# Altium schematic symbol library LATTICEPLDS_Library.SchLib: 291 symbols (part 9 of 32)
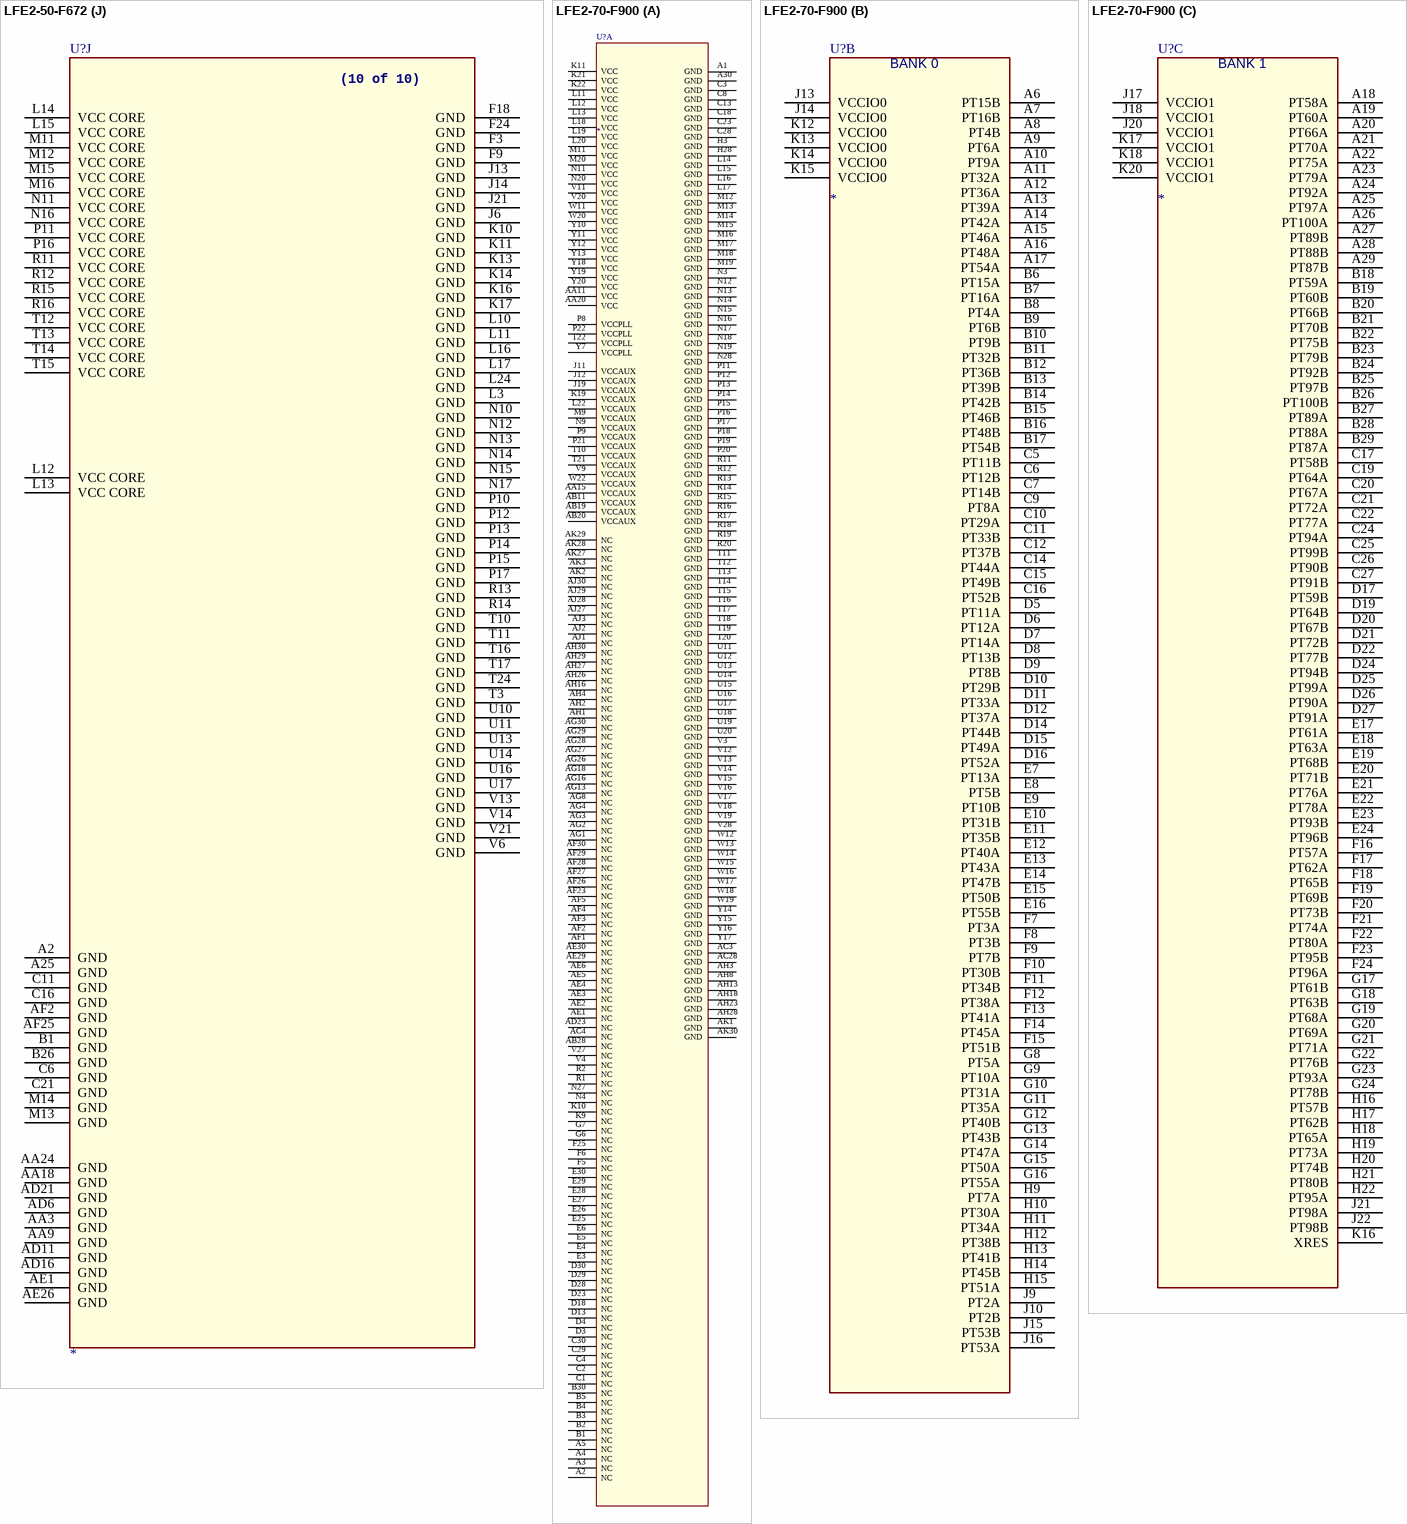
[diagram p311: symbols LFE2-50-F672 to LFE2-70-F900]

## LFE2-50-F672
designator U?
footprint fpBGA484
part A pins: D1 PL2B(H) / VREF1_7, D2 PL2A(H) / VREF2_7, E1 PL7B, E2 PL7A, E3 PL6B(H), E4 PL6A(H), F1 PL9B, F2 PL9A, F4 VCCIO_7 (power), F5 PL5B, F6 PL5A, G1 PL13B, G2 PL13A, G3 PL11B, G4 PL11A, H1 PL17A, H2 PL17B, H3 PL14A(H), H4 PL14B(H), H5 PL8B(H), H6 PL8A(H) / LDQS8, H7 PL12A(H), H8 PL10A(H), J1 PL19A, J2 PL19B, J3 PL16A(H) / LDQS16, J4 PL15B, J5 PL15A, J7 VCCIO_7 (power), J8 PL12B(H), J9 PL10B(H), K1 PL24A(H) / LDQS24, K2 PL23B, K3 PL23A, K4 PL16B(H), K5 PL39B(H), K6 PL18A(H), K7 PL18B(H), K8 PL38B, K9 VCCAUX_7 (power), L1 PL25A / LUM0_SPLLT_IN_A, L2 PL24B(H), L4 VCCIO_7 (power), L5 PL40B, L6 PL39A(H), L7 PL40A, L8 PL38A, L9 VCCAUX_7 (power), M1 PL26A / LUM0_SPLLT_FB_A, M2 PL25B / LUM0_SPLLC_IN_A, M6 PL42A, M7 PCLKT7_0 / PL44A, M8 LUM0_VCCPLL (power), M9 VCCIO_7 (power), M10 VCCIO_7 (power), N1 PL37A(H), N2 PL26B / LUM0_SPLLC_FB_A, N8 PL42B, N9 PCLKC7_0 / PL44B, P1 LDQS41 / PL41A(H) (in), P2 PL41B(H), R1 PL43A(H) (in), R2 PL43B(H)
part B pins: AA1 PL68A, AA2 PL60B(H) / LLM0_GDLLC_IN_A, AA4 VCCIO_6 (power), AB1 PL68B, AB2 PL75B(H), AB3 LDQS75 / PL75A(H), AC1 PL72A, AC2 PL78A, AD1 PL72B, AD2 PL74B, AD3 PL78B, AE2 PL74A, M4 PL46A(H) / PCLKT6_0, M5 PL46B(H) / PCLKC6_0, N3 PL48A(H), N4 PL48B(H), N5 PL49A, N7 PL47A / VREF2_6, P3 PL54A(H), P4 PL52B(H), P5 PL52A(H), P6 PL51B, P7 PL49B, P8 PL51A, P9 PL47B / VREF1_6, R3 PL54B(H), R4 PL55A, R5 PL57B, R6 PL58A(H) / LDQS58, R7 PL58B(H), R8 LLM0_VCCPLL (power), R9 VCCIO_6 (power), R10 VCCIO_6 (power), T1 PL50A(H) / LDQS50, T2 PL50B(H), T4 VCCIO_6 (power), T5 PL61A / LLM0_GDLLT_FB_A, T6 PL57A, T7 PL61B / LLM0_GDLLC_FB_A, T8 LLM0_PLLCAP (power), T9 VCCAUX_6 (power), U1 PL53A, U2 PL55B, U3 PL63A(H) / LLM0_GPLLT_IN_A, U4 PL63B(H) / LLM0_GPLLC_IN_A, U5 PL64B / LLM0_GPLLC_FB_A, U6 PL70B, U7 PL69B(H), U8 PL69A(H), U9 VCCAUX_6 (power), V1 PL53B, V2 PL56A(H), V3 PL64A / LLM0_GPLLT_FB_A, V4 PL65A(H), V5 PL65B(H), V7 VCCIO_6 (power), V8 PL70A, W1 PL59A, W2 PL56B(H), W3 PL67A(H) / LDQS67, W4 PL67B(H), W5 PL71B(H), W6 PL71A(H), W7 PL76A, W8 PL76B, Y1 PL60A(H) / LLM0_GDLLT_IN_A, Y2 PL59B, Y3 PL66A, Y4 PL66B, Y5 PL73B(H), Y6 PL73A(H), Y7 PL77A(H), Y8 PL77B(H)
part C pins: AA6 PB6A / BDSQ6, AA7 PB8A, AA10 PB21B, AA11 PB25A, AA12 PB30A, AA13 PB33B, AA14 PB38B, AA15 PB43B, AB6 PB6B, AB7 PB8B, AB8 PB23A, AB9 PB26A, AB10 PB23B, AB11 PB27B, AB12 PB31A, AB13 PB40B, AB14 PB41B, AB15 PB36A, AC4 PB3A, AC5 PB7A, AC6 VCCIO_5 (power), AC7 PB10A, AC8 PB22A, AC9 PB25B, AC10 PB29A, AC11 VCCIO_5 (power), AC12 PB32B, AC13 BDQS33 / PB33A, AC14 PB34B, AD4 PB3B, AD5 PB7B, AD7 PB10B, AD8 PB22B, AD9 PB26B, AD10 PB29B, AD12 PB32A, AD13 PB34A, AD14 PB43A, AE3 PB2A / VREF2_5, AE4 PB4A, AE5 PB9A, AE6 PB24A / BDSQ24, AE7 PB28A, AE8 PB35A, AE9 PB37A, AE10 PB39A, AE11 BDQS42 / PB42A, AE12 PCLKT5_0 / PB44A, AF3 PB2B / VREF1_5, AF4 PB4B, AF5 PB9B, AF6 PB24B, AF7 PB28B, AF8 PB35B, AF9 PB37B, AF10 PB39B, AF11 PB42B, AF12 PCLKC5_0 / PB44B, U12 VCCIO_5 (power), V9 PB5A, V10 VCCAUX_5 (power), V11 VCCAUX_5 (power), V12 VCCIO_5 (power), W9 PB5B, W10 PB20A, W11 PB21A, W12 PB30B, W13 PB38A, W14 PB40A, Y9 VCCIO_5 (power), Y10 PB20B, Y11 PB27A, Y12 PB31B, Y13 PB36B, Y14 PB41A
part D pins: AA16 PB53A, AA17 PB63B, AA19 PB65A, AA20 PB68A, AA21 PB79B, AB16 PB54B, AB17 PB51A / BDQS51, AB18 PB57B, AB19 PB61A, AB20 PB77A, AB21 BDQS78 / PB78A, AB22 PB81B, AB23 VREF1_4 / PB82B, AC15 PB49B / PCLKC4_0, AC16 VCCIO_4 (power), AC17 PB54A, AC18 PB59A, AC19 PB60A / BDQS60, AC20 PB77B, AC21 VCCIO_4 (power), AC22 PB78B, AC23 PB76B, AD15 PB49A / PCLKT4_0, AD17 PB58A, AD18 PB58B, AD19 PB59B, AD20 BDQS69 / PB69A, AD22 PB74B, AD23 PB76A, AE13 PB50A, AE14 PB52A, AE15 PB55A, AE16 PB56A, AE17 PB60B, AE18 PB62B, AE19 PB61B, AE20 PB67B, AE21 PB69B, AE22 PB74A, AE23 PB75B, AE24 PB80B, AF13 PB50B, AF14 PB52B, AF15 PB55B, AF16 PB56B, AF17 PB62A, AF18 PB64A, AF19 PB64B, AF20 PB67A, AF21 PB70A, AF22 PB70B, AF23 PB75A, AF24 PB80A, U15 VCCIO_4 (power), V15 VCCIO_4 (power), V16 VCCAUX_4 (power), V17 VCCAUX_4 (power), W15 PB53B, W16 PB63A, W17 PB65B, W18 PB68B, W19 PB79A, Y15 PB51B, Y16 PB57A, Y17 PB66B, Y18 VCCIO_4 (power), Y19 PB66A, Y20 PB81A, Y21 VREF2_4 / PB82A
part E pins: AA23 VCCIO_3 (power), AA26 PR69B(H), L25 PR46A(H) / PCLKT3_0, L26 PR46B(H) / PCLKC3_0, M25 PR48A(H), M26 PR48B(H), N18 PR47B / VREF2_3, N19 PR49B, N20 PR49A, N21 PR47A / VREF1_3, N22 PR51B, N25 PR50A(H) / RDQS50, N26 PR50B(H), P18 RLM0_VCCPLL (power), P19 PR53A, P20 PR54B(H), P21 PR53B, P22 PR52A(H), P23 PR52B(H), P25 PR56A(H), P26 PR56B(H), R17 VCCIO_3 (power), R18 VCCIO_3 (power), R19 PR54A(H), R20 RLM0_PLLCAP (power), R21 PR51A, R22 PR57B, R23 PR55A, R24 PR55B, R25 RDQS58 / PR58A(H), R26 PR58B(H), T18 VCCAUX_3 (power), T19 RLM0_GDLLC_FB_A / PR61B, T20 PR59B, T21 PR57A, T22 PR59A, T23 VCCIO_3 (power), T25 RLM0_GDLLC_IN_A / PR60B(H), T26 RLM0_GDLLT_IN_A / PR60A(H), U18 VCCAUX_3 (power), U19 PR68A, U20 RLM0_GDLLT_FB_A / PR61A, U21 PR68B, U22 RLM0_GPLLC_FB_A / PR64B, U23 RLM0_GPLLT_FB_A / PR64A, U24 RLM0_GPLLC_IN_A / PR63B(H), U25 RLM0_GPLLT_IN_A / PR63A(H), U26 PR65A(H), V20 VCCIO_3 (power), V23 PR70A, V24 PR66B, V25 PR66A, V26 PR65B(H), W24 PR70B, W25 PR67B(H), W26 RDSQ67 / PR67A(H), Y26 PR69A(H)
part F pins: B24 PR7B, B25 PR9A, C23 PR6A(H), C24 PR7A, C25 PR10A(H), C26 PR12A(H), D23 PR6B(H), D24 PR9B, D25 PR10B(H), D26 PR12B(H), E22 PR2B(H) / VREF2_2, E24 PR11A, E25 PR16A(H) / RDQS16, E26 PR16B(H), F21 PR2A(H) / VREF1_2, F22 PR11B, F23 VCCIO_2 (power), F25 PR18A(H), F26 PR18B(H), G21 PR5B, G22 PR8A(H) / RDQS8, G23 PR14A(H), G24 PR14B(H), G25 PR19A, G26 PR19B, H20 PR5A, H21 PR8B(H), H22 PR15A, H23 PR23A, H24 PR23B, H25 RDQS24 / PR24A(H), H26 PR24B(H), J19 PR13A, J20 VCCIO_2 (power), J22 PR15B, J23 RUM0_SPLLC_IN_A / PR25B, J24 PR37A(H), J25 RUM0_SPLLT_FB_A / PR26A, J26 RUM0_SPLLC_FB_A / PR26B, K18 VCCAUX_2 (power), K19 PR13B, K20 PR17B, K21 PR38B, K22 PR43A(H), K23 RUM0_SPLLT_IN_A / PR25A, K24 PR37B(H), K25 RDQS41 / PR41A(H), K26 PR41B(H), L18 VCCAUX_2 (power), L19 PR17A, L20 RUM0_VCCPLL (power), L21 PR43B(H), L22 PR39B(H), L23 VCCIO_2 (power), M17 VCCIO_2 (power), M18 VCCIO_2 (power), M19 PR40A, M20 PR40B, M21 PR38A, M22 PR39A(H), M23 PCLKT2_0 / PR44A, M24 PR42B, N23 PR42A, N24 PCLKC2_0 / PR44B
part G pins: A12 PT49B, A13 PT53B, A14 PT55B, A15 PT54A, A16 PT57B, A17 PT61B, A18 PT64A, A19 PT66A, A20 PT66B, A21 PT74A, A22 PT74B, A23 PT79A, A24 PT79B, B12 PT49A, B13 PT53A, B14 PT55A, B15 PT57A, B16 PT60A, B17 PT61A, B18 PT64B, B19 PT69A, B20 PT70A, B21 PT70B, B22 PT76B, B23 PT76A, C14 PT51A, C15 PT54B, C17 PT59B, C18 PT60B, C19 PT71A, C20 PT75B, C22 PT77B, D13 PT51B, D14 PT48A / PCLKT1_0, D15 PT56B, D16 VCCIO_1 (power), D17 PT59A, D18 PT65A, D19 PT69B, D20 PT75A, D21 VCCIO_1 (power), D22 VREF1_1 / PT82A, E14 PT50A, E15 PT58B, E16 PT63B, E17 PT65B, E18 PT68A, E19 PT71B, E20 PT77A, E21 PT78B, E23 VREF2_1 / PT82B, F14 PT48B / PCLKC1_0, F15 PT56A, F16 PT62B, F17 PT67A, F19 PT78A, F20 PT80B, G14 PT50B, G15 PT58A, G16 PT63A, G17 PT68B, G18 VCCIO_1 (power), G19 PT67B, G20 PT81B, H15 PT52A, H17 PT52B, H18 PT62A, H19 PT80A, J15 VCCIO_1 (power), J16 VCCAUX_1 (power), J17 VCCAUX_1 (power), J18 PT81A, K15 VCCIO_1 (power)
part H pins: A3 PT9A, A4 PT9B, A5 PT27B, A6 PT32B, A7 PT35B, A8 PT37B, A9 PT39B, A10 PT42B, A11 PT45B, B2 PT8A, B3 PT8B, B4 PT22B, B5 PT27A, B6 PT32A, B7 PT35A, B8 PT37A, B9 PT39A, B10 PT42A, B11 PT45A, C1 PT6A, C2 PT6B, C3 PT10A, C4 PT10B, C5 PT23B, C7 PT26B, C8 PT31A, C9 PT36A, C10 PT41A, C12 PT41B, C13 PT44B, D3 PT7A, D4 PT7B, D5 PT23A, D6 VCCIO_0 (power), D7 PT26A, D8 PT31B, D9 PT29A, D10 PT34A, D11 VCCIO_0 (power), D12 PT43B, E5 PT3A, E6 PT3B, E7 PT4B, E8 PT25B, E9 PT29B, E10 PT30A, E11 PT36B, E12 PT38B, E13 PT44A, F7 PT4A, F8 PT24B, F10 PT25A, F11 PT30B, F12 PT34B, F13 PT43A, G5 PT2A / VREF1_0, G6 PT2B / VREF2_0, G7 PT5A, G8 PT5B, G9 VCCIO_0 (power), G10 PT28B, G11 PT33A, G12 PT38A, G13 PT40B, H9 PT24A, H10 PT28A, H11 PT33B, H12 PT40A, H13 PCLKT0_0 / PT46A, H14 PCLKC0_0 / PT46B, J10 VCCAUX_0 (power), J11 VCCAUX_0 (power), J12 VCCIO_0 (power), K12 VCCIO_0 (power)
part I pins: AA5 TDO (out), AA8 TDI (in), AA22 CCLK, AA25 PR73B / D5, AB4 TMS (in), AB5 VCCJ (power), AB24 INITN, AB25 PR76A / D0, AB26 PR73A / D6 / SPID1, AC3 TCK (in), AC24 CFG0, AC25 PR76B / CSN, AC26 PR75A / D2, AD24 CFG2, AD25 DONE, AD26 PR75B / D1, AE25 VCCIO_8 (power), H16 XRES, V18 VCCIO_8 (power), V19 PROGRAMN, V22 PR72A / DI / CSSPI0N, W20 CFG1, W21 PR77B / WRITEN, W22 PR74A / D4, W23 PR72B / D7 / SPID0, Y22 PR77A / CS1N, Y23 PR74B / D3, Y24 PR71B / DOUT/CSON / CSSPI1N, Y25 PR71A / BUSY / SISPI
part J pins: A2 GND (power), A25 GND (power), AA3 GND (power), AA9 GND (power), AA18 GND (power), AA24 GND (power), AD6 GND (power), AD11 GND (power), AD16 GND (power), AD21 GND (power), AE1 GND (power), AE26 GND (power), AF2 GND (power), AF25 GND (power), B1 GND (power), B26 GND (power), C6 GND (power), C11 GND (power), C16 GND (power), C21 GND (power), F3 GND (power), F9 GND (power), F18 GND (power), F24 GND (power), J6 GND (power), J13 GND (power), J14 GND (power), J21 GND (power), K10 GND (power), K11 GND (power), K13 GND (power), K14 GND (power), K16 GND (power), K17 GND (power), L3 GND (power), L10 GND (power), L11 GND (power), L12 VCC CORE (power), L13 VCC CORE (power), L14 VCC CORE (power), L15 VCC CORE (power), L16 GND (power), L17 GND (power), L24 GND (power), M11 VCC CORE (power), M12 VCC CORE (power), M13 GND (power), M14 GND (power), M15 VCC CORE (power), M16 VCC CORE (power), N10 GND (power), N11 VCC CORE (power), N12 GND (power), N13 GND (power), N14 GND (power), N15 GND (power), N16 VCC CORE (power), N17 GND (power), P10 GND (power), P11 VCC CORE (power), P12 GND (power), P13 GND (power), P14 GND (power), P15 GND (power), P16 VCC CORE (power), P17 GND (power), R11 VCC CORE (power), R12 VCC CORE (power), R13 GND (power), R14 GND (power), R15 VCC CORE (power), R16 VCC CORE (power), T3 GND (power), T10 GND (power), T11 GND (power), T12 VCC CORE (power), T13 VCC CORE (power), T14 VCC CORE (power), T15 VCC CORE (power), T16 GND (power), T17 GND (power), T24 GND (power), U10 GND (power), U11 GND (power), U13 GND (power), U14 GND (power), U16 GND (power), U17 GND (power), V6 GND (power), V13 GND (power), V14 GND (power), V21 GND (power)
part A text: BANK7; (1 of 10); DQS Group
part B text: BANK6; (2 of 10); DQS Group
part C text: BANK5; (3 of 10); DQS Group
part D text: BANK4; (4 of 10); DQS Group
part E text: BANK3; (5 of 10); DQS Group
part F text: BANK2; (6 of 10); DQS Group
part G text: BANK1; (7 of 10)
part H text: BANK0; (8 of 10)
part I text: BANK8; (9 of 10)
part J text: (10 of 10)

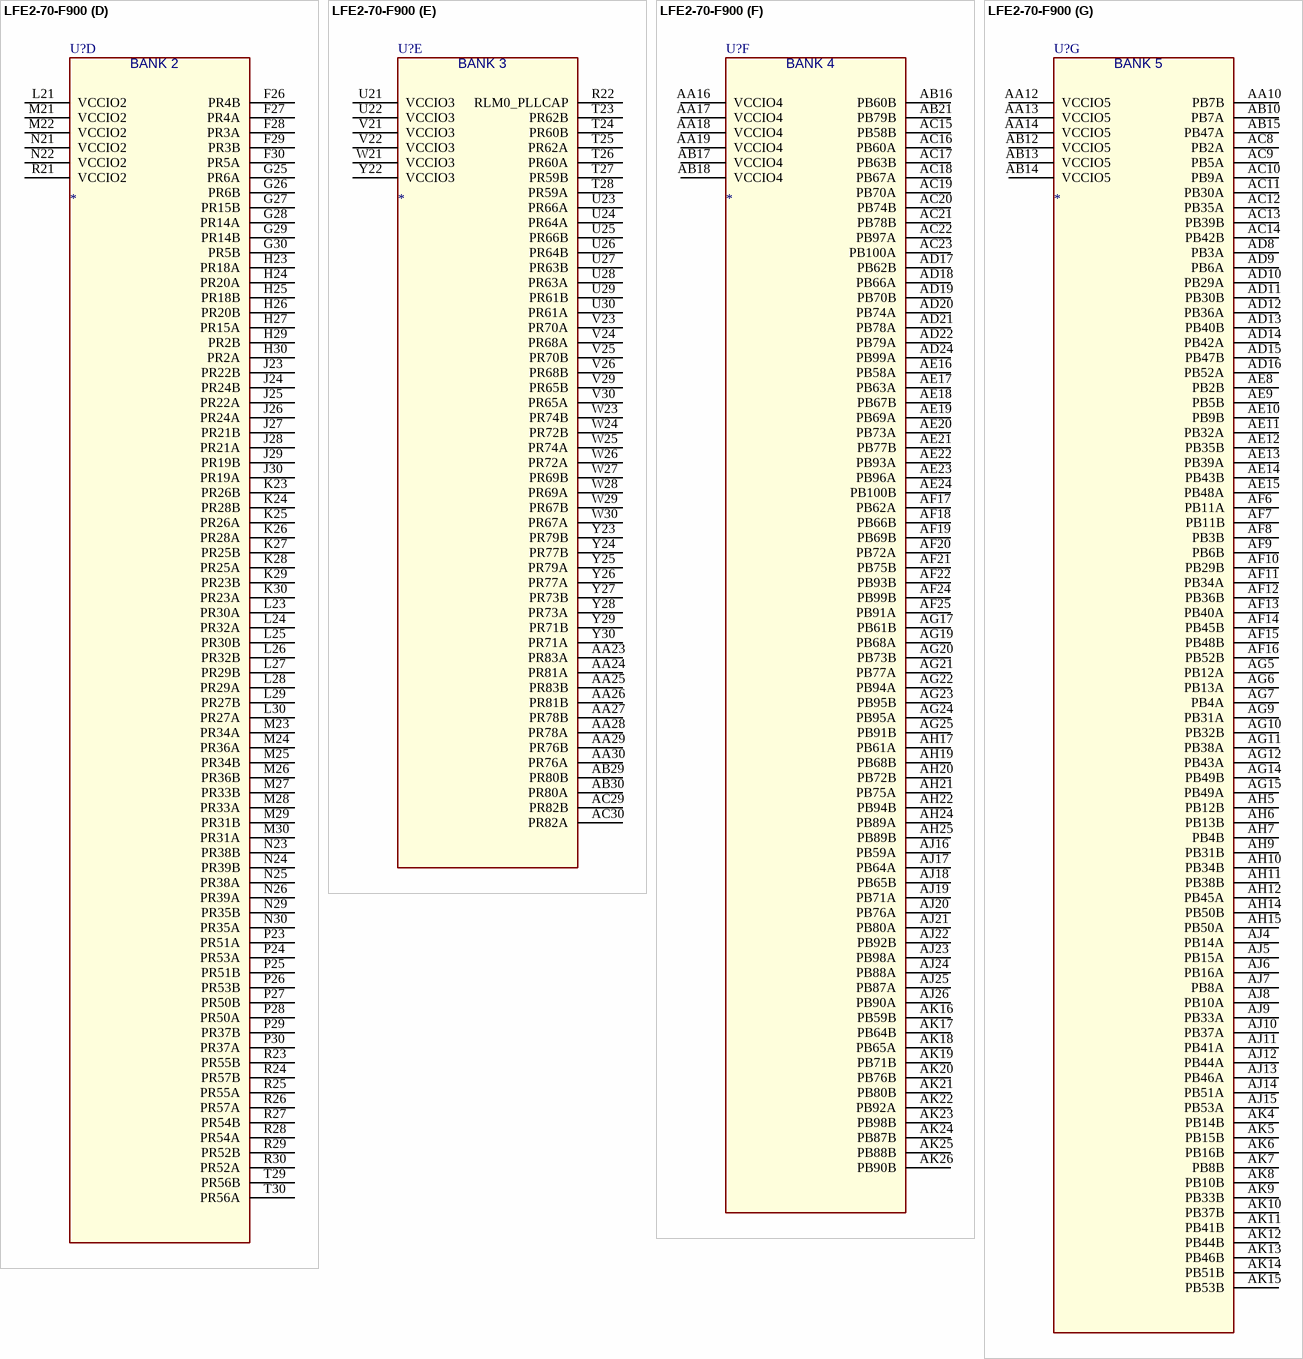
[diagram p91: symbol LFE2-70-F900]

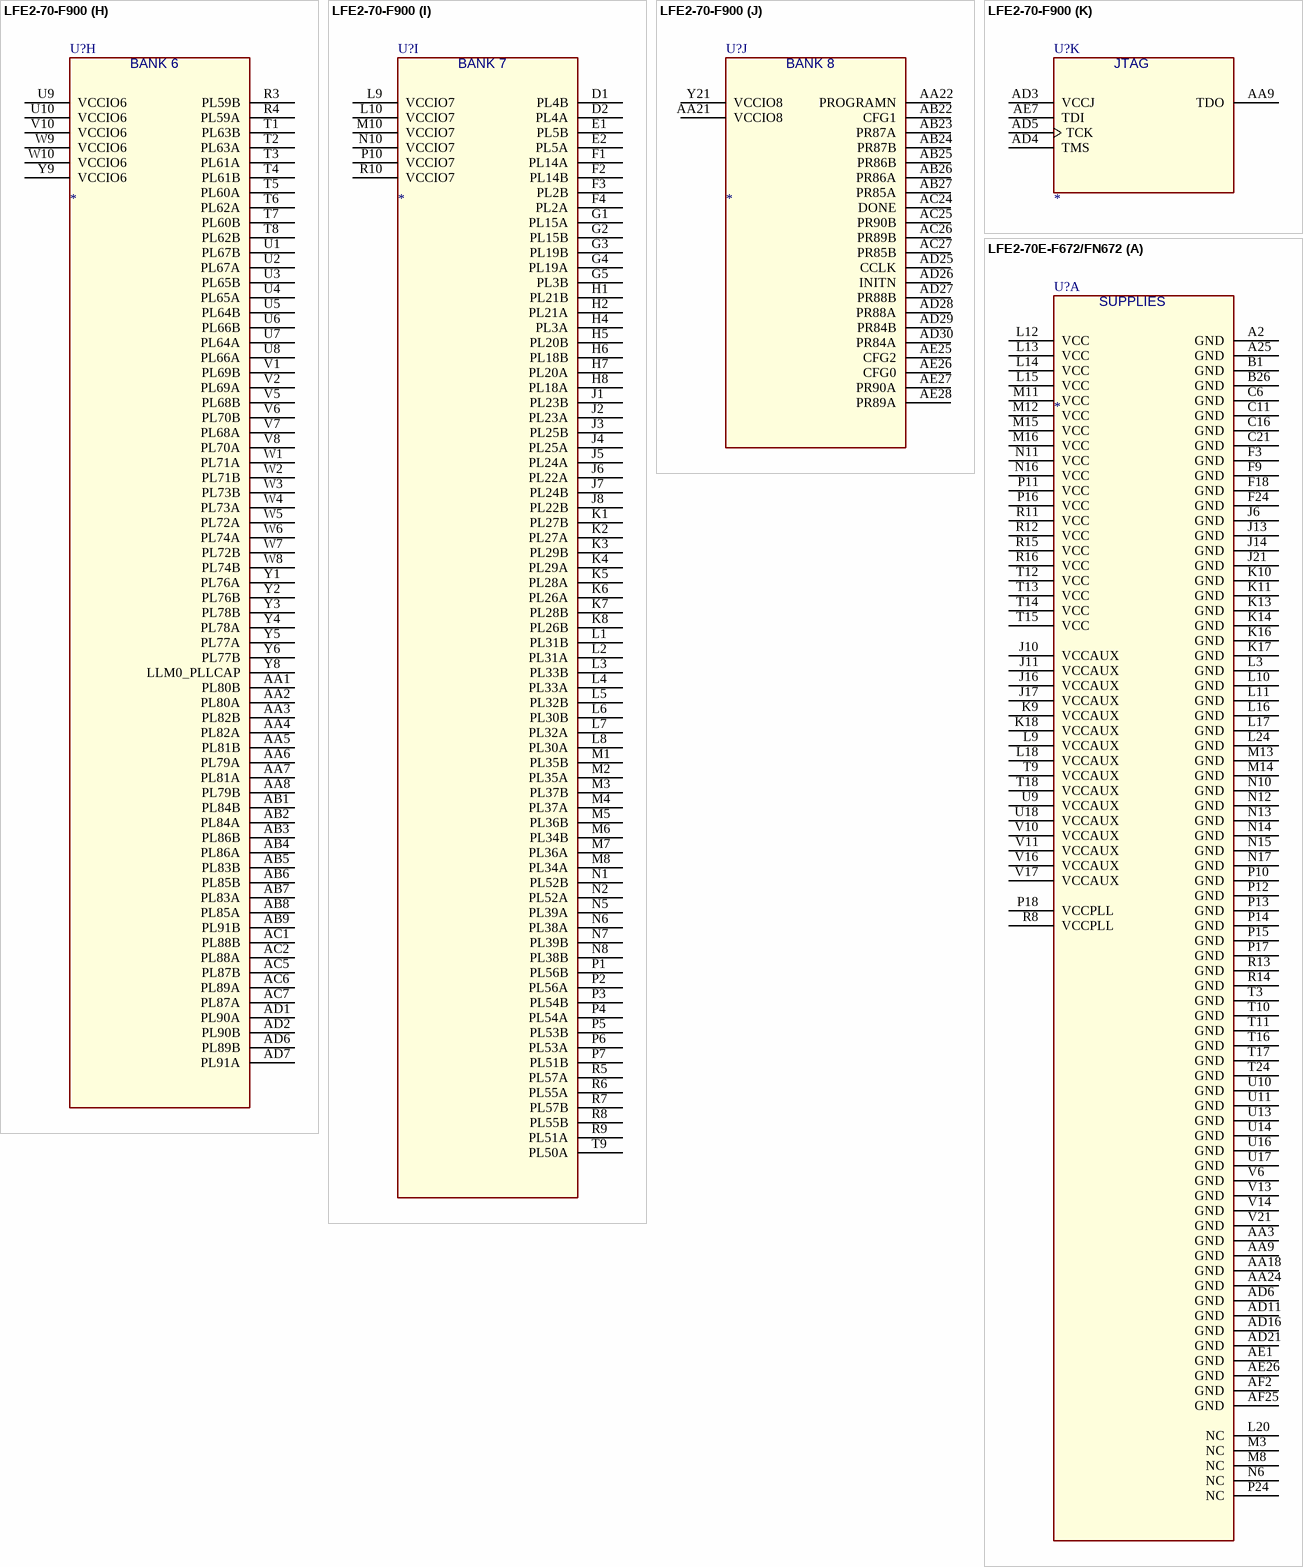
[diagram p92: symbols LFE2-70-F900 to LFE2-70E-F672/FN672]

## LFE2-70-F900
designator U?
SPLIT_INST: TRUE; SWAP_INFO: (S1+S2+S3+S4+S5+S6+S7+S8+S9+S10+S11)
part A pins: A1 GND (power), A2 NC, A3 NC, A4 NC, A5 NC, A30 GND (power), AA11 VCC (power), AA15 VCCAUX (power), AA20 VCC (power), AB11 VCCAUX (power), AB19 VCCAUX (power), AB20 VCCAUX (power), AB28 NC, AC3 GND (power), AC4 NC, AC28 GND (power), AD23 NC, AE1 NC, AE2 NC, AE3 NC, AE4 NC, AE5 NC, AE6 NC, AE29 NC, AE30 NC, AF1 NC, AF2 NC, AF3 NC, AF4 NC, AF5 NC, AF23 NC, AF26 NC, AF27 NC, AF28 NC, AF29 NC, AF30 NC, AG1 NC, AG2 NC, AG3 NC, AG4 NC, AG8 NC, AG13 NC, AG16 NC, AG18 NC, AG26 NC, AG27 NC, AG28 NC, AG29 NC, AG30 NC, AH1 NC, AH2 NC, AH3 GND (power), AH4 NC, AH8 GND (power), AH13 GND (power), AH16 NC, AH18 GND (power), AH23 GND (power), AH26 NC, AH27 NC, AH28 GND (power), AH29 NC, AH30 NC, AJ1 NC, AJ2 NC, AJ3 NC, AJ27 NC, AJ28 NC, AJ29 NC, AJ30 NC, AK1 GND (power), AK2 NC, AK3 NC, AK27 NC, AK28 NC, AK29 NC, AK30 GND (power), B1 NC, B2 NC, B3 NC, B4 NC, B5 NC, B30 NC, C1 NC, C2 NC, C3 GND (power), C4 NC, C8 GND (power), C13 GND (power), C18 GND (power), C23 GND (power), C28 GND (power), C29 NC, C30 NC, D3 NC, D4 NC, D13 NC, D18 NC, D23 NC, D28 NC, D29 NC, D30 NC, E3 NC, E4 NC, E5 NC, E6 NC, E25 NC, E26 NC, E27 NC, E28 NC, E29 NC, E30 NC, F5 NC, F6 NC, F25 NC, G6 NC, G7 NC, H3 GND (power), H28 GND (power), J11 VCCAUX (power), J12 VCCAUX (power), J19 VCCAUX (power), K9 NC, K10 NC, K11 VCC (power), K19 VCCAUX (power), K21 VCC (power), K22 VCC (power), L11 VCC (power), L12 VCC (power), L13 VCC (power), L14 GND (power), L15 GND (power), L16 GND (power), L17 GND (power), L18 VCC (power), L19 VCC (power), L20 VCC (power), L22 VCCAUX (power), M9 VCCAUX (power), M11 VCC (power), M12 GND (power), M13 GND (power), M14 GND (power), M15 GND (power), M16 GND (power), M17 GND (power), M18 GND (power), M19 GND (power), M20 VCC (power), N3 GND (power), N4 NC, N9 VCCAUX (power), N11 VCC (power), N12 GND (power), N13 GND (power), N14 GND (power), N15 GND (power), N16 GND (power), N17 GND (power), N18 GND (power), N19 GND (power), N20 VCC (power), N27 NC, N28 GND (power), P8 VCCPLL (power), P9 VCCAUX (power), P11 GND (power), P12 GND (power), P13 GND (power), P14 GND (power), P15 GND (power), P16 GND (power), P17 GND (power), P18 GND (power), P19 GND (power), P20 GND (power), P21 VCCAUX (power), P22 VCCPLL (power), R1 NC, R2 NC, R11 GND (power), R12 GND (power), R13 GND (power), R14 GND (power), R15 GND (power), R16 GND (power), R17 GND (power), R18 GND (power), R19 GND (power), R20 GND (power), T10 VCCAUX (power), T11 GND (power), T12 GND (power), T13 GND (power), T14 GND (power), T15 GND (power), T16 GND (power), T17 GND (power), T18 GND (power), T19 GND (power), T20 GND (power), T21 VCCAUX (power), T22 VCCPLL (power), U11 GND (power), U12 GND (power), U13 GND (power), U14 GND (power), U15 GND (power), U16 GND (power), U17 GND (power), U18 GND (power), U19 GND (power), U20 GND (power), V3 GND (power), V4 NC, V9 VCCAUX (power), V11 VCC (power), V12 GND (power), V13 GND (power), V14 GND (power), V15 GND (power), V16 GND (power), V17 GND (power), V18 GND (power), V19 GND (power), V20 VCC (power), V27 NC, V28 GND (power), W11 VCC (power), W12 GND (power), W13 GND (power), W14 GND (power), W15 GND (power), W16 GND (power), W17 GND (power), W18 GND (power), W19 GND (power), W20 VCC (power), W22 VCCAUX (power), Y7 VCCPLL (power), Y10 VCC (power), Y11 VCC (power), Y12 VCC (power), Y13 VCC (power), Y14 GND (power), Y15 GND (power), Y16 GND (power), Y17 GND (power), Y18 VCC (power), Y19 VCC (power), Y20 VCC (power)
part B pins: A6 PT15B, A7 PT16B, A8 PT4B, A9 PT6A, A10 PT9A, A11 PT32A, A12 PT36A, A13 PT39A, A14 PT42A, A15 PT46A, A16 PT48A, A17 PT54A, B6 PT15A, B7 PT16A, B8 PT4A, B9 PT6B, B10 PT9B, B11 PT32B, B12 PT36B, B13 PT39B, B14 PT42B, B15 PT46B, B16 PT48B, B17 PT54B, C5 PT11B, C6 PT12B, C7 PT14B, C9 PT8A, C10 PT29A, C11 PT33B, C12 PT37B, C14 PT44A, C15 PT49B, C16 PT52B, D5 PT11A, D6 PT12A, D7 PT14A, D8 PT13B, D9 PT8B, D10 PT29B, D11 PT33A, D12 PT37A, D14 PT44B, D15 PT49A, D16 PT52A, E7 PT13A, E8 PT5B, E9 PT10B, E10 PT31B, E11 PT35B, E12 PT40A, E13 PT43A, E14 PT47B, E15 PT50B, E16 PT55B, F7 PT3A, F8 PT3B, F9 PT7B, F10 PT30B, F11 PT34B, F12 PT38A, F13 PT41A, F14 PT45A, F15 PT51B, G8 PT5A, G9 PT10A, G10 PT31A, G11 PT35A, G12 PT40B, G13 PT43B, G14 PT47A, G15 PT50A, G16 PT55A, H9 PT7A, H10 PT30A, H11 PT34A, H12 PT38B, H13 PT41B, H14 PT45B, H15 PT51A, J9 PT2A, J10 PT2B, J13 VCCIO0 (power), J14 VCCIO0 (power), J15 PT53B, J16 PT53A, K12 VCCIO0 (power), K13 VCCIO0 (power), K14 VCCIO0 (power), K15 VCCIO0 (power)
part C pins: A18 PT58A, A19 PT60A, A20 PT66A, A21 PT70A, A22 PT75A, A23 PT79A, A24 PT92A, A25 PT97A, A26 PT100A, A27 PT89B, A28 PT88B, A29 PT87B, B18 PT59A, B19 PT60B, B20 PT66B, B21 PT70B, B22 PT75B, B23 PT79B, B24 PT92B, B25 PT97B, B26 PT100B, B27 PT89A, B28 PT88A, B29 PT87A, C17 PT58B, C19 PT64A, C20 PT67A, C21 PT72A, C22 PT77A, C24 PT94A, C25 PT99B, C26 PT90B, C27 PT91B, D17 PT59B, D19 PT64B, D20 PT67B, D21 PT72B, D22 PT77B, D24 PT94B, D25 PT99A, D26 PT90A, D27 PT91A, E17 PT61A, E18 PT63A, E19 PT68B, E20 PT71B, E21 PT76A, E22 PT78A, E23 PT93B, E24 PT96B, F16 PT57A, F17 PT62A, F18 PT65B, F19 PT69B, F20 PT73B, F21 PT74A, F22 PT80A, F23 PT95B, F24 PT96A, G17 PT61B, G18 PT63B, G19 PT68A, G20 PT69A, G21 PT71A, G22 PT76B, G23 PT93A, G24 PT78B, H16 PT57B, H17 PT62B, H18 PT65A, H19 PT73A, H20 PT74B, H21 PT80B, H22 PT95A, J17 VCCIO1 (power), J18 VCCIO1 (power), J20 VCCIO1 (power), J21 PT98A, J22 PT98B, K16 XRES, K17 VCCIO1 (power), K18 VCCIO1 (power), K20 VCCIO1 (power)
part D pins: F26 PR4B, F27 PR4A, F28 PR3A, F29 PR3B, F30 PR5A, G25 PR6A, G26 PR6B, G27 PR15B, G28 PR14A, G29 PR14B, G30 PR5B, H23 PR18A, H24 PR20A, H25 PR18B, H26 PR20B, H27 PR15A, H29 PR2B, H30 PR2A, J23 PR22B, J24 PR24B, J25 PR22A, J26 PR24A, J27 PR21B, J28 PR21A, J29 PR19B, J30 PR19A, K23 PR26B, K24 PR28B, K25 PR26A, K26 PR28A, K27 PR25B, K28 PR25A, K29 PR23B, K30 PR23A, L21 VCCIO2 (power), L23 PR30A, L24 PR32A, L25 PR30B, L26 PR32B, L27 PR29B, L28 PR29A, L29 PR27B, L30 PR27A, M21 VCCIO2 (power), M22 VCCIO2 (power), M23 PR34A, M24 PR36A, M25 PR34B, M26 PR36B, M27 PR33B, M28 PR33A, M29 PR31B, M30 PR31A, N21 VCCIO2 (power), N22 VCCIO2 (power), N23 PR38B, N24 PR39B, N25 PR38A, N26 PR39A, N29 PR35B, N30 PR35A, P23 PR51A, P24 PR53A, P25 PR51B, P26 PR53B, P27 PR50B, P28 PR50A, P29 PR37B, P30 PR37A, R21 VCCIO2 (power), R23 PR55B, R24 PR57B, R25 PR55A, R26 PR57A, R27 PR54B, R28 PR54A, R29 PR52B, R30 PR52A, T29 PR56B, T30 PR56A
part E pins: AA23 PR83A, AA24 PR81A, AA25 PR83B, AA26 PR81B, AA27 PR78B, AA28 PR78A, AA29 PR76B, AA30 PR76A, AB29 PR80B, AB30 PR80A, AC29 PR82B, AC30 PR82A, R22 RLM0_PLLCAP, T23 PR62B, T24 PR60B, T25 PR62A, T26 PR60A, T27 PR59B, T28 PR59A, U21 VCCIO3 (power), U22 VCCIO3 (power), U23 PR66A, U24 PR64A, U25 PR66B, U26 PR64B, U27 PR63B, U28 PR63A, U29 PR61B, U30 PR61A, V21 VCCIO3 (power), V22 VCCIO3 (power), V23 PR70A, V24 PR68A, V25 PR70B, V26 PR68B, V29 PR65B, V30 PR65A, W21 VCCIO3 (power), W23 PR74B, W24 PR72B, W25 PR74A, W26 PR72A, W27 PR69B, W28 PR69A, W29 PR67B, W30 PR67A, Y22 VCCIO3 (power), Y23 PR79B, Y24 PR77B, Y25 PR79A, Y26 PR77A, Y27 PR73B, Y28 PR73A, Y29 PR71B, Y30 PR71A
part F pins: AA16 VCCIO4 (power), AA17 VCCIO4 (power), AA18 VCCIO4 (power), AA19 VCCIO4 (power), AB16 PB60B, AB17 VCCIO4 (power), AB18 VCCIO4 (power), AB21 PB79B, AC15 PB58B, AC16 PB60A, AC17 PB63B, AC18 PB67A, AC19 PB70A, AC20 PB74B, AC21 PB78B, AC22 PB97A, AC23 PB100A, AD17 PB62B, AD18 PB66A, AD19 PB70B, AD20 PB74A, AD21 PB78A, AD22 PB79A, AD24 PB99A, AE16 PB58A, AE17 PB63A, AE18 PB67B, AE19 PB69A, AE20 PB73A, AE21 PB77B, AE22 PB93A, AE23 PB96A, AE24 PB100B, AF17 PB62A, AF18 PB66B, AF19 PB69B, AF20 PB72A, AF21 PB75B, AF22 PB93B, AF24 PB99B, AF25 PB91A, AG17 PB61B, AG19 PB68A, AG20 PB73B, AG21 PB77A, AG22 PB94A, AG23 PB95B, AG24 PB95A, AG25 PB91B, AH17 PB61A, AH19 PB68B, AH20 PB72B, AH21 PB75A, AH22 PB94B, AH24 PB89A, AH25 PB89B, AJ16 PB59A, AJ17 PB64A, AJ18 PB65B, AJ19 PB71A, AJ20 PB76A, AJ21 PB80A, AJ22 PB92B, AJ23 PB98A, AJ24 PB88A, AJ25 PB87A, AJ26 PB90A, AK16 PB59B, AK17 PB64B, AK18 PB65A, AK19 PB71B, AK20 PB76B, AK21 PB80B, AK22 PB92A, AK23 PB98B, AK24 PB87B, AK25 PB88B, AK26 PB90B